# Altium footprint library 封装库.PcbLib: 755 footprints (part 1 of 48)
Each footprint in its own frame and in the unit in brackets; x right, y up, seen from the top. Pads: shape width x height; smd on the part's side, far side on the other; paste and mask are expansions set on the pad; w line width, h text height; cw(c..) or ccw(c..) is an arc to the next point about the centre after c.
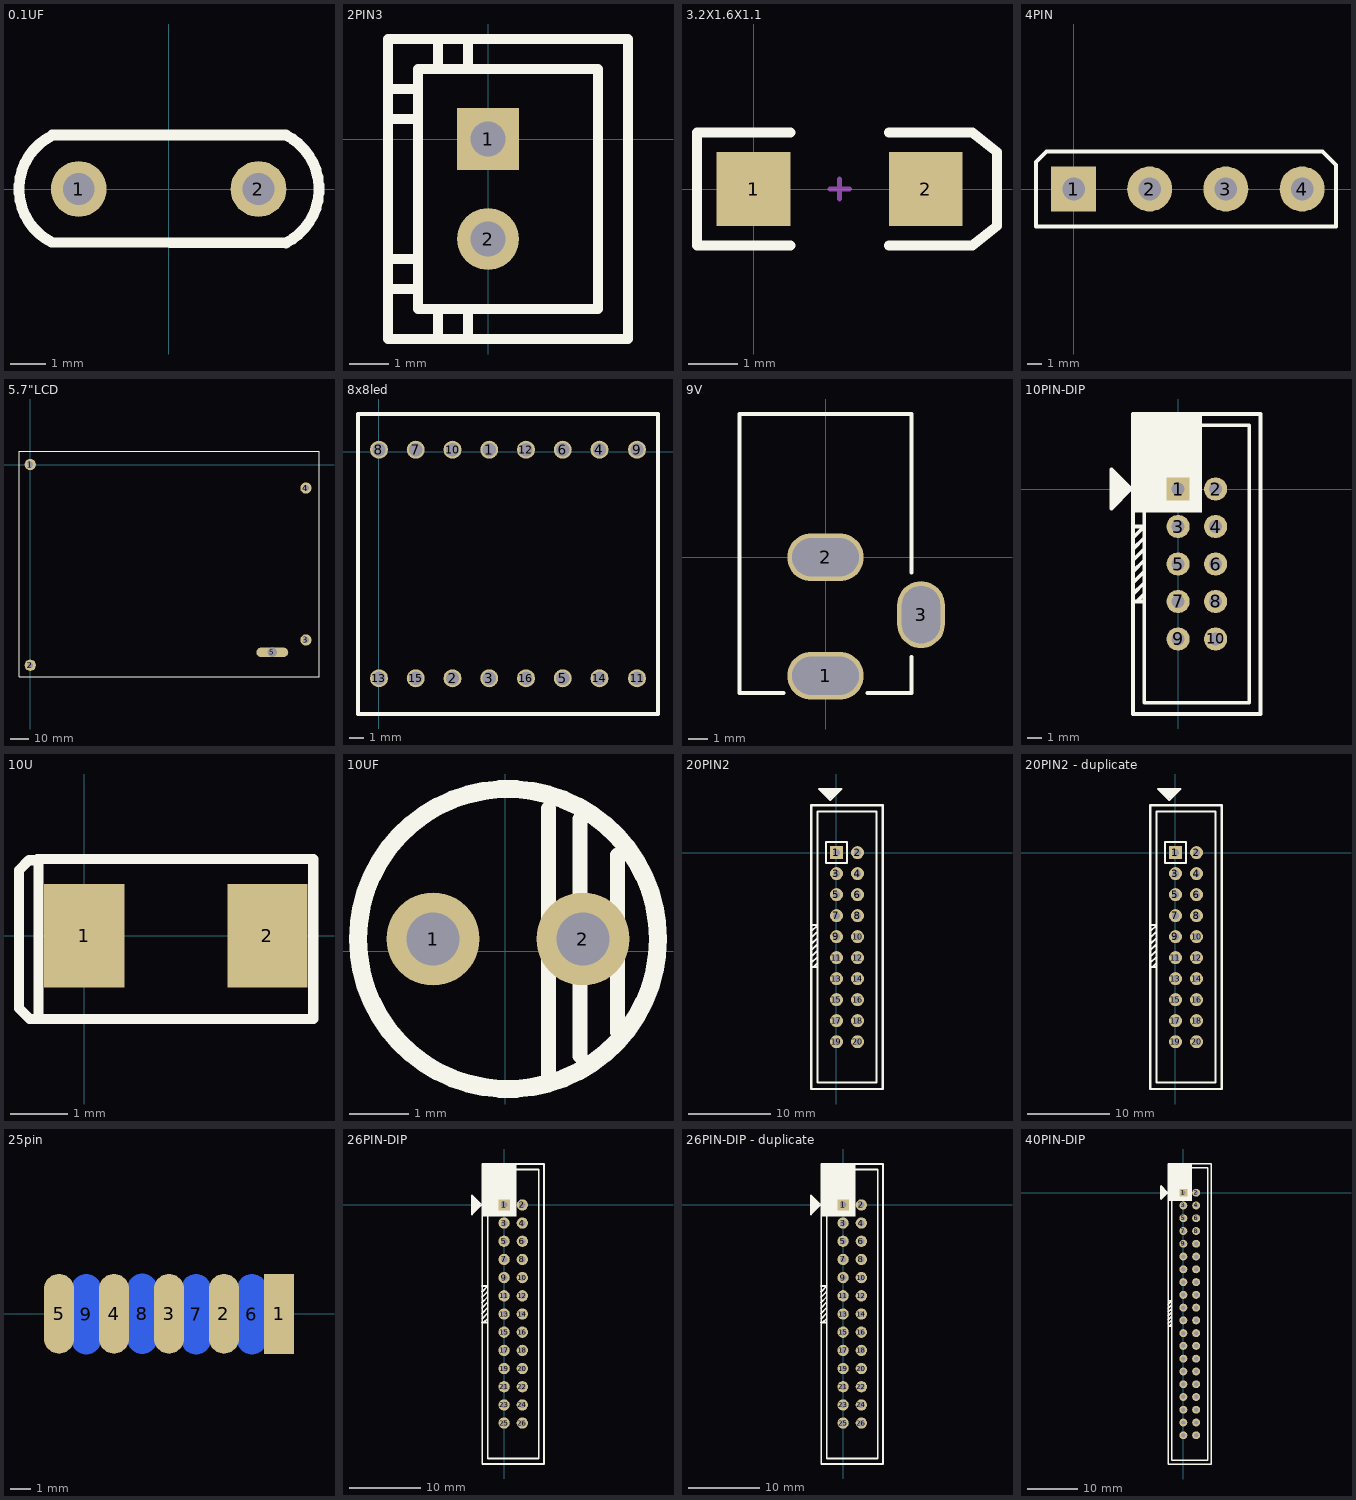
[diagram p0: the footprints below, top view; thin cyan lines are the x and y axes]

## 0.1UF [mil]
pads (2):
  round 62 hole 35.43: 1(-100,0) 2(100,0)
Top Overlay:
  lines w12: -130.04,59.28 ccw(c-100,0) -130.04,-59.28 130.54,-59.99 ccw(c100,0) 130.54,59.99 -129.42,60.22

## 2PIN3 [mil]
pads (2):
  rect 62x62 hole 35: 1(0,0)
  round 62 hole 35: 2(0,-100)
Top Overlay:
  lines w10: -100,-150 -70,-150 ; -100,-120 -70,-120 ; -100,20 -70,20 ; -100,50 -70,50 ; -50,-200 -50,-170 ; -50,70 -50,100 ; -20,-200 -20,-170 ; -20,70 -20,100 ; -100,-200 -100,100 0,100 140,100 140,-200 -100,-200 ; -70,-170 -70,70 110,70 110,-170 -70,-170
Multi-Layer:
  text "Comment" at -105,113 h25

## 3.2X1.6X1.1 [mm] "SMT LED; 2 Flat Leads"
pads (2):
  rect 1.5x1.5 smd: 1(0,0) 2(3.5,0)
Top Overlay:
  lines w0.2: 0.75,-1.15 -1.15,-1.15 -1.15,1.15 0.75,1.15 ; 2.75,-1.15 4.45,-1.15 4.95,-0.75 4.95,0.75 4.45,1.15 2.75,1.15
Mechanical 1:
  lines w0.1: 1.55,0 1.95,0 ; 1.75,-0.2 1.75,0.2

## 4PIN [mm]
pads (4):
  rect 3x3 hole 1.5: 1(0,0)
  round 3 hole 1.5: 2(5.08,0) 3(10.16,0) 4(15.24,0)
Top Overlay:
  lines w0.254: -2.5,-2.5 -2.5,1.8 -1.8,2.5 16.6,2.5 17.5,1.6 17.5,-2.5 -2.5,-2.5

## 5.7"LCD [mm]
pads (5):
  round 6 hole 3.1: 1(0,0) 2(0,-107) 3(147,-93.5) 4(147,-12.5)
  oval 17x5 hole 5: 5(129.1,-100.1)
Top Overlay:
  lines w0.305: -6,-113 -6,7 154,7 154,-113 -6,-113

## 8x8led [mm]
pads (16):
  round 1.2 hole 0.889: 1(7.35,0.12) 2(4.9,-15.12) 3(7.35,-15.12) 4(14.7,0.12) 5(12.25,-15.12) 6(12.25,0.12) 7(2.45,0.12) 8(0,0.12) 9(17.2,0.12) 10(4.9,0.12) 11(17.2,-15.12) 12(9.8,0.12) 13(0,-15.12) 14(14.7,-15.12) 15(2.45,-15.12) 16(9.8,-15.12)
Top Layer:
Top Overlay:
  lines w0.254: -1.4,-17.5 18.6,-17.5 18.6,2.5 -1.4,2.5 -1.4,-17.5

## 9V [mm]
pads (3):
  oval 4x2.5 hole 2 slot 3.5 at 0 deg: 1(0,-6.207) 2(0,-0.007)
  oval 2.5x3.5 hole 2 slot 3 at 90 deg: 3(5,-3.007)
Top Overlay:
  lines w0.2: -2.2,-7.107 -4.5,-7.107 -4.5,7.493 4.5,7.493 4.5,-0.807 ; 2.2,-7.107 4.5,-7.107 4.5,-5.207

## 10PIN-DIP [mil]
pads (10):
  rect 62x62 hole 35: 1(0,0)
  round 62 hole 35: 2(100,0) 3(0,-100) 4(100,-100) 5(0,-200) 6(100,-200) 7(0,-300) 8(100,-300) 9(0,-400) 10(100,-400)
Top Overlay:
  region: -120,-62.2 63.78,-62.2 63.78,200 -120,200
  lines w10: -177.56,-19.68 -177.56,-51.97 -177.17,-52.36 -177.17,-51.97 -124.57,0.63 -124.57,0.79 -124.57,-0.39 -124.57,-0.24 -177.56,52.76 -177.56,-35.04 -170.2,-38.46 -170.2,45.4 ; -161.49,36.68 -161.49,-32.21 -161.42,-32.28 ; -153.15,-24.8 -152.66,-24.31 -152.66,27.86 ; -144.06,-12.17 -144.06,19.26 ; -136.72,-5.23 -136.72,11.92 ; -120,-280 -90,-250 ; -120,-250 -90,-220 ; -120,-220 -90,-190 ; -120,-190 -90,-160 ; -120,-160 -90,-130 ; -120,-130 -90,-100 -120,-100 ; -90,-300 -120,-300 -110,-300 -90,-280 ; -120,-600 -120,-500 -120,200 220,200 220,-500 220,-600 -120,-600 ; -90,-570 -90,170 190,170 190,-570 -90,-570 ; -60,-50 50,-50 50,60 -60,60 -60,-50
Multi-Layer:
  text "Comment" at -185.06,213 h25

## 10U [mm]
pads (2):
  rect 1.4x1.8 smd: 1(0,0) 2(3.2,0)
Top Overlay:
  lines w0.178: -0.826,-1.454 4,-1.454 4,-1 4,1 4,1.34 -0.82,1.34 -0.8,1.32 ; -0.826,-1.454 -0.8,-1.428 -0.8,-1 -0.8,1 -0.8,1.32 ; -0.826,-1.454 -0.953,-1.454 -1.141,-1.266 -1.141,1.147 -0.967,1.32 -0.8,1.32

## 10UF [mil]
pads (2):
  round 62 hole 35.43: 1(-48,8) 2(52,8)
Top Overlay:
  circle w12: c2,8 r100
  lines w10: 29,-85 29,95 ; 50,-70 50,88 ; 75,-54 75,64

## 20PIN2 [mil]
pads (20):
  rect 62x62 hole 35: 1(0,0)
  round 62 hole 35: 2(100,0) 3(0,-100) 4(100,-100) 5(0,-200) 6(100,-200) 7(0,-300) 8(100,-300) 9(0,-400) 10(100,-400) 11(0,-500) 12(100,-500) 13(0,-600) 14(100,-600) 15(0,-700) 16(100,-700) 17(0,-800) 18(100,-800) 19(0,-900) 20(100,-900)
Top Overlay:
  lines w10: -120,-525 -90,-495 ; -120,-495 -90,-465 ; -120,-465 -90,-435 ; -120,-435 -90,-405 ; -120,-405 -90,-375 ; -120,-375 -90,-345 -120,-345 ; -90,-545 -120,-545 -110,-545 -90,-525 ; -62.28,286.42 -62.21,286.49 6.68,286.49 ; -54.8,278.15 -54.31,277.66 -2.14,277.66 ; -49.68,302.56 -81.97,302.56 -82.36,302.17 -81.97,302.17 -29.37,249.57 -29.21,249.57 -30.39,249.57 -30.24,249.57 22.76,302.56 -65.04,302.56 -68.46,295.2 15.4,295.2 ; -42.17,269.06 -10.74,269.06 ; -35.23,261.72 -18.08,261.72 ; -120,-1125 220,-1125 220,225 0,225 -120,225 -120,-1125 ; -90,-1095 190,-1095 190,195 -90,195 -90,-1095 ; -50,-50 -50,50 50,50 50,-50 -50,-50

## 20PIN2 - duplicate [mm] "Connector; Header; 10x2 Position"
pads (20):
  rect 1.575x1.575 hole 0.889: 1(0,0)
  round 1.575 hole 0.889: 2(2.54,0) 3(0,-2.54) 4(2.54,-2.54) 5(0,-5.08) 6(2.54,-5.08) 7(0,-7.62) 8(2.54,-7.62) 9(0,-10.16) 10(2.54,-10.16) 11(0,-12.7) 12(2.54,-12.7) 13(0,-15.24) 14(2.54,-15.24) 15(0,-17.78) 16(2.54,-17.78) 17(0,-20.32) 18(2.54,-20.32) 19(0,-22.86) 20(2.54,-22.86)
Top Overlay:
  lines w0.254: -3.048,-13.335 -2.286,-12.573 ; -3.048,-12.573 -2.286,-11.811 ; -3.048,-11.811 -2.286,-11.049 ; -3.048,-11.049 -2.286,-10.287 ; -3.048,-10.287 -2.286,-9.525 ; -3.048,-9.525 -2.286,-8.763 -3.048,-8.763 ; -2.286,-13.843 -3.048,-13.843 -2.794,-13.843 -2.286,-13.335 ; -1.582,7.275 -1.58,7.277 0.17,7.277 ; -1.392,7.065 -1.379,7.053 -0.054,7.053 ; -1.262,7.685 -2.082,7.685 -2.092,7.675 -2.082,7.675 -0.746,6.339 -0.742,6.339 -0.772,6.339 -0.768,6.339 0.578,7.685 -1.652,7.685 -1.739,7.498 0.391,7.498 ; -1.071,6.834 -0.273,6.834 ; -0.895,6.648 -0.459,6.648 ; -3.048,-28.575 -3.048,5.715 0,5.715 5.588,5.715 5.588,-28.575 -3.048,-28.575 ; -2.286,-27.813 -2.286,4.953 4.826,4.953 4.826,-27.813 -2.286,-27.813 ; -1.27,-1.27 1.27,-1.27 1.27,1.27 -1.27,1.27 -1.27,-1.27

## 25pin [mm]
height 12.93
pads (9):
  rect 1.5x4 smd: 1(33,0)
  oval 1.5x4 smd: 2(30.25,0) 3(27.5,0) 4(24.75,0) 5(22,0)
  oval 1.5x4 smd far side: 6(31.648,-0.025) 7(28.854,-0.025) 8(26.162,0) 9(23.368,-0.025)

## 26PIN-DIP [mil]
pads (26):
  rect 62x62 hole 35: 1(0,0)
  round 62 hole 35: 2(100,0) 3(0,-100) 4(100,-100) 5(0,-200) 6(100,-200) 7(0,-300) 8(100,-300) 9(0,-400) 10(100,-400) 11(0,-500) 12(100,-500) 13(0,-600) 14(100,-600) 15(0,-700) 16(100,-700) 17(0,-800) 18(100,-800) 19(0,-900) 20(100,-900) 21(0,-1000) 22(100,-1000) 23(0,-1100) 24(100,-1100) 25(0,-1200) 26(100,-1200)
Top Overlay:
  region: -120,-63.39 66.14,-63.39 66.14,225 -120,225
  lines w10: -177.56,-19.68 -177.56,-51.97 -177.17,-52.36 -177.17,-51.97 -124.57,0.63 -124.57,0.79 -124.57,-0.39 -124.57,-0.24 -177.56,52.76 -177.56,-35.04 -170.2,-38.46 -170.2,45.4 ; -161.49,36.68 -161.49,-32.21 -161.42,-32.28 ; -153.15,-24.8 -152.66,-24.31 -152.66,27.86 ; -144.06,-12.17 -144.06,19.26 ; -136.72,-5.23 -136.72,11.92 ; -121.45,-626.45 -91.45,-596.45 ; -121.45,-596.45 -91.45,-566.45 ; -121.45,-566.45 -91.45,-536.45 ; -121.45,-536.45 -91.45,-506.45 ; -121.45,-506.45 -91.45,-476.45 ; -121.45,-476.45 -91.45,-446.45 -121.45,-446.45 ; -91.45,-646.45 -121.45,-646.45 -111.45,-646.45 -91.45,-626.45 ; -120,-1425 -120,-1225 -120,-1125 -120,225 0,225 220,225 220,-1125 220,-1225 220,-1425 -120,-1425 ; -90,-1395 -90,-1195 -90,-1095 -90,195 190,195 190,-1095 190,-1195 190,-1395 -90,-1395 ; -50,-50 -50,50 50,50 50,-50 -50,-50
Multi-Layer:
  text "Comment" at -185.06,238 h25

## 26PIN-DIP - duplicate [mil]
pads (26):
  rect 62x62 hole 35: 1(0,0)
  round 62 hole 35: 2(100,0) 3(0,-100) 4(100,-100) 5(0,-200) 6(100,-200) 7(0,-300) 8(100,-300) 9(0,-400) 10(100,-400) 11(0,-500) 12(100,-500) 13(0,-600) 14(100,-600) 15(0,-700) 16(100,-700) 17(0,-800) 18(100,-800) 19(0,-900) 20(100,-900) 21(0,-1000) 22(100,-1000) 23(0,-1100) 24(100,-1100) 25(0,-1200) 26(100,-1200)
Top Overlay:
  region: -120,-63.39 66.14,-63.39 66.14,225 -120,225
  lines w10: -177.56,-19.68 -177.56,-51.97 -177.17,-52.36 -177.17,-51.97 -124.57,0.63 -124.57,0.79 -124.57,-0.39 -124.57,-0.24 -177.56,52.76 -177.56,-35.04 -170.2,-38.46 -170.2,45.4 ; -161.49,36.68 -161.49,-32.21 -161.42,-32.28 ; -153.15,-24.8 -152.66,-24.31 -152.66,27.86 ; -144.06,-12.17 -144.06,19.26 ; -136.72,-5.23 -136.72,11.92 ; -121.45,-626.45 -91.45,-596.45 ; -121.45,-596.45 -91.45,-566.45 ; -121.45,-566.45 -91.45,-536.45 ; -121.45,-536.45 -91.45,-506.45 ; -121.45,-506.45 -91.45,-476.45 ; -121.45,-476.45 -91.45,-446.45 -121.45,-446.45 ; -91.45,-646.45 -121.45,-646.45 -111.45,-646.45 -91.45,-626.45 ; -120,-1425 -120,-1225 -120,-1125 -120,225 0,225 220,225 220,-1125 220,-1225 220,-1425 -120,-1425 ; -90,-1395 -90,-1195 -90,-1095 -90,195 190,195 190,-1095 190,-1195 190,-1395 -90,-1395 ; -50,-50 -50,50 50,50 50,-50 -50,-50
Multi-Layer:
  text "Comment" at -185.06,238 h25

## 40PIN-DIP [mil]
pads (40):
  rect 62x62 hole 35: 1(0,0)
  round 62 hole 35: 2(100,0) 3(0,-100) 4(100,-100) 5(0,-200) 6(100,-200) 7(0,-300) 8(100,-300) 9(0,-400) 10(100,-400) 11(0,-500) 12(100,-500) 13(0,-600) 14(100,-600) 15(0,-700) 16(100,-700) 17(0,-800) 18(100,-800) 19(0,-900) 20(100,-900) 21(0,-1000) 22(100,-1000) 23(0,-1100) 24(100,-1100) 25(0,-1200) 26(100,-1200) 27(0,-1300) 28(100,-1300) 29(0,-1400) 30(100,-1400) 31(0,-1500) 32(100,-1500) 33(0,-1600) 34(100,-1600) 35(0,-1700) 36(100,-1700) 37(0,-1800) 38(100,-1800) 39(0,-1900) 40(100,-1900)
Top Overlay:
  region: -120,-63.39 66.14,-63.39 66.14,225 -120,225
  lines w10: -178.35,-19.68 -178.35,-51.97 -177.95,-52.36 -177.95,-51.97 -125.35,0.63 -125.35,0.79 -125.35,-0.39 -125.35,-0.24 -178.35,52.76 -178.35,-35.04 -170.99,-38.46 -170.99,45.4 ; -162.27,36.68 -162.27,-32.21 -162.2,-32.28 ; -153.94,-24.8 -153.45,-24.31 -153.45,27.86 ; -144.85,-12.17 -144.85,19.26 ; -137.51,-5.23 -137.51,11.92 ; -120.33,-1027 -90.33,-997 ; -120.33,-997 -90.33,-967 ; -120.33,-967 -90.33,-937 ; -120.33,-937 -90.33,-907 ; -120.33,-907 -90.33,-877 ; -120.33,-877 -90.33,-847 -120.33,-847 ; -90.33,-1047 -120.33,-1047 -110.33,-1047 -90.33,-1027 ; -120,-2125 220,-2125 220,-1125 220,225 0,225 -120,225 -120,-1125 -120,-2120 -120,-2125 ; -90,-2095 190,-2095 190,-1095 190,195 -90,195 -90,-1095 -90,-2095 ; -50,-50 50,-50 50,50 -50,50 -50,-50
Multi-Layer:
  text "Comment" at -183.35,238 h25